# Altium footprint library Connector_Samtec_HLE_SMD.PcbLib: 290 footprints (part 14 of 24) (continued)
## Samtec_HLE-136-02-xxx-DV-A_2x36_P2.54mm_Horizontal [mm]
pads (74):
  rect 1.27x2.29 smd: 1(-44.45,2.525) 2(-44.45,-2.525) 3(-41.91,2.525) 4(-41.91,-2.525) 5(-39.37,2.525) 6(-39.37,-2.525) 7(-36.83,2.525) 8(-36.83,-2.525) 9(-34.29,2.525) 10(-34.29,-2.525) 11(-31.75,2.525) 12(-31.75,-2.525) 13(-29.21,2.525) 14(-29.21,-2.525) 15(-26.67,2.525) 16(-26.67,-2.525) 17(-24.13,2.525) 18(-24.13,-2.525) 19(-21.59,2.525) 20(-21.59,-2.525) 21(-19.05,2.525) 22(-19.05,-2.525) 23(-16.51,2.525) 24(-16.51,-2.525) 25(-13.97,2.525) 26(-13.97,-2.525) 27(-11.43,2.525) 28(-11.43,-2.525) 29(-8.89,2.525) 30(-8.89,-2.525) 31(-6.35,2.525) 32(-6.35,-2.525) 33(-3.81,2.525) 34(-3.81,-2.525) 35(-1.27,2.525) 36(-1.27,-2.525) 37(1.27,2.525) 38(1.27,-2.525) 39(3.81,2.525) 40(3.81,-2.525) 41(6.35,2.525) 42(6.35,-2.525) 43(8.89,2.525) 44(8.89,-2.525) 45(11.43,2.525) 46(11.43,-2.525) 47(13.97,2.525) 48(13.97,-2.525) 49(16.51,2.525) 50(16.51,-2.525) 51(19.05,2.525) 52(19.05,-2.525) 53(21.59,2.525) 54(21.59,-2.525) 55(24.13,2.525) 56(24.13,-2.525) 57(26.67,2.525) 58(26.67,-2.525) 59(29.21,2.525) 60(29.21,-2.525) 61(31.75,2.525) 62(31.75,-2.525) 63(34.29,2.525) 64(34.29,-2.525) 65(36.83,2.525) 66(36.83,-2.525) 67(39.37,2.525) 68(39.37,-2.525) 69(41.91,2.525) 70(41.91,-2.525) 71(44.45,2.525) 72(44.45,-2.525)
  round 1.78 hole 1.78: Un1(43.18,0) Un2(-43.18,0)
F.SilkS:
  lines w0.12: -45.345,-2.65 -45.83,-2.65 -45.83,2.65 -45.345,2.65 -45.345,3.67 ; -43.555,-2.65 -42.805,-2.65 ; -43.555,2.65 -42.805,2.65 ; -41.015,-2.65 -40.265,-2.65 ; -41.015,2.65 -40.265,2.65 ; -38.475,-2.65 -37.725,-2.65 ; -38.475,2.65 -37.725,2.65 ; -35.935,-2.65 -35.185,-2.65 ; -35.935,2.65 -35.185,2.65 ; -33.395,-2.65 -32.645,-2.65 ; -33.395,2.65 -32.645,2.65 ; -30.855,-2.65 -30.105,-2.65 ; -30.855,2.65 -30.105,2.65 ; -28.315,-2.65 -27.565,-2.65 ; -28.315,2.65 -27.565,2.65 ; -25.775,-2.65 -25.025,-2.65 ; -25.775,2.65 -25.025,2.65 ; -23.235,-2.65 -22.485,-2.65 ; -23.235,2.65 -22.485,2.65 ; -20.695,-2.65 -19.945,-2.65 ; -20.695,2.65 -19.945,2.65 ; -18.155,-2.65 -17.405,-2.65 ; -18.155,2.65 -17.405,2.65 ; -15.615,-2.65 -14.865,-2.65 ; -15.615,2.65 -14.865,2.65 ; -13.075,-2.65 -12.325,-2.65 ; -13.075,2.65 -12.325,2.65 ; -10.535,-2.65 -9.785,-2.65 ; -10.535,2.65 -9.785,2.65 ; -7.995,-2.65 -7.245,-2.65 ; -7.995,2.65 -7.245,2.65 ; -5.455,-2.65 -4.705,-2.65 ; -5.455,2.65 -4.705,2.65 ; -2.915,-2.65 -2.165,-2.65 ; -2.915,2.65 -2.165,2.65 ; -0.375,-2.65 0.375,-2.65 ; -0.375,2.65 0.375,2.65 ; 2.165,-2.65 2.915,-2.65 ; 2.165,2.65 2.915,2.65 ; 4.705,-2.65 5.455,-2.65 ; 4.705,2.65 5.455,2.65 ; 7.245,-2.65 7.995,-2.65 ; 7.245,2.65 7.995,2.65 ; 9.785,-2.65 10.535,-2.65 ; 9.785,2.65 10.535,2.65 ; 12.325,-2.65 13.075,-2.65 ; 12.325,2.65 13.075,2.65 ; 14.865,-2.65 15.615,-2.65 ; 14.865,2.65 15.615,2.65 ; 17.405,-2.65 18.155,-2.65 ; 17.405,2.65 18.155,2.65 ; 19.945,-2.65 20.695,-2.65 ; 19.945,2.65 20.695,2.65 ; 22.485,-2.65 23.235,-2.65 ; 22.485,2.65 23.235,2.65 ; 25.025,-2.65 25.775,-2.65 ; 25.025,2.65 25.775,2.65 ; 27.565,-2.65 28.315,-2.65 ; 27.565,2.65 28.315,2.65 ; 30.105,-2.65 30.855,-2.65 ; 30.105,2.65 30.855,2.65 ; 32.645,-2.65 33.395,-2.65 ; 32.645,2.65 33.395,2.65 ; 35.185,-2.65 35.935,-2.65 ; 35.185,2.65 35.935,2.65 ; 37.725,-2.65 38.475,-2.65 ; 37.725,2.65 38.475,2.65 ; 40.265,-2.65 41.015,-2.65 ; 40.265,2.65 41.015,2.65 ; 42.805,-2.65 43.555,-2.65 ; 42.805,2.65 43.555,2.65 ; 45.345,-2.65 45.83,-2.65 45.83,2.65 45.345,2.65
F.CrtYd:
  lines w0.05: -46.22,-4.17 -46.22,4.17 46.22,4.17 46.22,-4.17 -46.22,-4.17
F.Fab:
  lines w0.1: -44.95,2.54 -44.45,1.833 -43.95,2.54 ; -45.72,-2.54 45.72,-2.54 45.72,2.54 -45.72,2.54 -45.72,-2.54
  text "'.Designator'" at -4.047,-2.68 h1

## Samtec_HLE-136-02-xxx-DV-BE-A_2x36_P2.54mm_Horizontal [mm]
pads (146):
  rect 1.27x1.68 smd: 1(-44.45,2.72) 2(-44.45,-2.72) 3(-41.91,2.72) 4(-41.91,-2.72) 5(-39.37,2.72) 6(-39.37,-2.72) 7(-36.83,2.72) 8(-36.83,-2.72) 9(-34.29,2.72) 10(-34.29,-2.72) 11(-31.75,2.72) 12(-31.75,-2.72) 13(-29.21,2.72) 14(-29.21,-2.72) 15(-26.67,2.72) 16(-26.67,-2.72) 17(-24.13,2.72) 18(-24.13,-2.72) 19(-21.59,2.72) 20(-21.59,-2.72) 21(-19.05,2.72) 22(-19.05,-2.72) 23(-16.51,2.72) 24(-16.51,-2.72) 25(-13.97,2.72) 26(-13.97,-2.72) 27(-11.43,2.72) 28(-11.43,-2.72) 29(-8.89,2.72) 30(-8.89,-2.72) 31(-6.35,2.72) 32(-6.35,-2.72) 33(-3.81,2.72) 34(-3.81,-2.72) 35(-1.27,2.72) 36(-1.27,-2.72) 37(1.27,2.72) 38(1.27,-2.72) 39(3.81,2.72) 40(3.81,-2.72) 41(6.35,2.72) 42(6.35,-2.72) 43(8.89,2.72) 44(8.89,-2.72) 45(11.43,2.72) 46(11.43,-2.72) 47(13.97,2.72) 48(13.97,-2.72) 49(16.51,2.72) 50(16.51,-2.72) 51(19.05,2.72) 52(19.05,-2.72) 53(21.59,2.72) 54(21.59,-2.72) 55(24.13,2.72) 56(24.13,-2.72) 57(26.67,2.72) 58(26.67,-2.72) 59(29.21,2.72) 60(29.21,-2.72) 61(31.75,2.72) 62(31.75,-2.72) 63(34.29,2.72) 64(34.29,-2.72) 65(36.83,2.72) 66(36.83,-2.72) 67(39.37,2.72) 68(39.37,-2.72) 69(41.91,2.72) 70(41.91,-2.72) 71(44.45,2.72) 72(44.45,-2.72)
  round 0.97 hole 0.97: Un1(-8.89,-1.27) Un2(19.05,-1.27) Un3(44.45,-1.27) Un4(-3.81,1.27) Un5(-11.43,1.27) Un7(-19.05,1.27) Un8(-16.51,1.27) Un9(34.29,1.27) Un10(-36.83,1.27) Un11(-41.91,-1.27) Un12(-31.75,-1.27) Un13(21.59,-1.27) Un14(6.35,1.27) Un15(-16.51,-1.27) Un16(31.75,-1.27) Un18(-6.35,1.27) Un19(34.29,-1.27) Un20(-24.13,1.27) Un21(31.75,1.27) Un22(39.37,-1.27) Un23(24.13,-1.27) Un24(-21.59,-1.27) Un25(-13.97,1.27) Un26(44.45,1.27) Un27(-26.67,1.27) Un28(-11.43,-1.27) Un29(16.51,1.27) Un30(-13.97,-1.27) Un31(26.67,1.27) Un32(13.97,-1.27) Un33(39.37,1.27) Un34(16.51,-1.27) Un35(-44.45,1.27) Un36(-3.81,-1.27) Un37(-1.27,-1.27) Un38(-31.75,1.27) Un39(-24.13,-1.27) Un40(-1.27,1.27) Un41(-34.29,-1.27) Un42(11.43,1.27) Un43(29.21,-1.27) Un44(-19.05,-1.27) Un45(3.81,-1.27) Un46(-34.29,1.27) Un47(-39.37,1.27) Un48(21.59,1.27) Un49(13.97,1.27) Un50(-44.45,-1.27) Un51(24.13,1.27) Un52(11.43,-1.27) Un53(26.67,-1.27) Un54(6.35,-1.27) Un55(8.89,1.27) Un56(36.83,1.27) Un57(-6.35,-1.27) Un58(3.81,1.27) Un59(19.05,1.27) Un60(41.91,-1.27) Un61(1.27,1.27) Un62(-29.21,1.27) Un63(-21.59,1.27) Un64(-8.89,1.27) Un65(-41.91,1.27) Un66(-29.21,-1.27) Un67(29.21,1.27) Un68(1.27,-1.27) Un69(41.91,1.27) Un70(-39.37,-1.27) Un71(8.89,-1.27) Un72(36.83,-1.27) Un73(-26.67,-1.27) Un74(-36.83,-1.27)
  round 1.78 hole 1.78: Un6(-43.18,0) Un17(43.18,0)
F.SilkS:
  lines w0.12: -45.345,-2.65 -45.83,-2.65 -45.83,2.65 -45.345,2.65 -45.345,3.56 ; -43.555,-2.65 -42.805,-2.65 ; -43.555,2.65 -42.805,2.65 ; -41.015,-2.65 -40.265,-2.65 ; -41.015,2.65 -40.265,2.65 ; -38.475,-2.65 -37.725,-2.65 ; -38.475,2.65 -37.725,2.65 ; -35.935,-2.65 -35.185,-2.65 ; -35.935,2.65 -35.185,2.65 ; -33.395,-2.65 -32.645,-2.65 ; -33.395,2.65 -32.645,2.65 ; -30.855,-2.65 -30.105,-2.65 ; -30.855,2.65 -30.105,2.65 ; -28.315,-2.65 -27.565,-2.65 ; -28.315,2.65 -27.565,2.65 ; -25.775,-2.65 -25.025,-2.65 ; -25.775,2.65 -25.025,2.65 ; -23.235,-2.65 -22.485,-2.65 ; -23.235,2.65 -22.485,2.65 ; -20.695,-2.65 -19.945,-2.65 ; -20.695,2.65 -19.945,2.65 ; -18.155,-2.65 -17.405,-2.65 ; -18.155,2.65 -17.405,2.65 ; -15.615,-2.65 -14.865,-2.65 ; -15.615,2.65 -14.865,2.65 ; -13.075,-2.65 -12.325,-2.65 ; -13.075,2.65 -12.325,2.65 ; -10.535,-2.65 -9.785,-2.65 ; -10.535,2.65 -9.785,2.65 ; -7.995,-2.65 -7.245,-2.65 ; -7.995,2.65 -7.245,2.65 ; -5.455,-2.65 -4.705,-2.65 ; -5.455,2.65 -4.705,2.65 ; -2.915,-2.65 -2.165,-2.65 ; -2.915,2.65 -2.165,2.65 ; -0.375,-2.65 0.375,-2.65 ; -0.375,2.65 0.375,2.65 ; 2.165,-2.65 2.915,-2.65 ; 2.165,2.65 2.915,2.65 ; 4.705,-2.65 5.455,-2.65 ; 4.705,2.65 5.455,2.65 ; 7.245,-2.65 7.995,-2.65 ; 7.245,2.65 7.995,2.65 ; 9.785,-2.65 10.535,-2.65 ; 9.785,2.65 10.535,2.65 ; 12.325,-2.65 13.075,-2.65 ; 12.325,2.65 13.075,2.65 ; 14.865,-2.65 15.615,-2.65 ; 14.865,2.65 15.615,2.65 ; 17.405,-2.65 18.155,-2.65 ; 17.405,2.65 18.155,2.65 ; 19.945,-2.65 20.695,-2.65 ; 19.945,2.65 20.695,2.65 ; 22.485,-2.65 23.235,-2.65 ; 22.485,2.65 23.235,2.65 ; 25.025,-2.65 25.775,-2.65 ; 25.025,2.65 25.775,2.65 ; 27.565,-2.65 28.315,-2.65 ; 27.565,2.65 28.315,2.65 ; 30.105,-2.65 30.855,-2.65 ; 30.105,2.65 30.855,2.65 ; 32.645,-2.65 33.395,-2.65 ; 32.645,2.65 33.395,2.65 ; 35.185,-2.65 35.935,-2.65 ; 35.185,2.65 35.935,2.65 ; 37.725,-2.65 38.475,-2.65 ; 37.725,2.65 38.475,2.65 ; 40.265,-2.65 41.015,-2.65 ; 40.265,2.65 41.015,2.65 ; 42.805,-2.65 43.555,-2.65 ; 42.805,2.65 43.555,2.65 ; 45.345,-2.65 45.83,-2.65 45.83,2.65 45.345,2.65
F.CrtYd:
  lines w0.05: -46.22,-4.06 46.22,-4.06 46.22,4.06 -46.22,4.06 -46.22,-4.06
F.Fab:
  lines w0.1: -44.95,2.54 -44.45,1.833 -43.95,2.54 ; -45.72,-2.54 -45.72,2.54 45.72,2.54 45.72,-2.54 -45.72,-2.54
  text "'.Designator'" at -4.047,-2.68 h1

## Samtec_HLE-136-02-xxx-DV-BE-LC_2x36_P2.54mm_Horizontal [mm]
pads (146):
  rect 1.27x1.68 smd: 1(-44.45,2.72) 2(-44.45,-2.72) 3(-41.91,2.72) 4(-41.91,-2.72) 5(-39.37,2.72) 6(-39.37,-2.72) 7(-36.83,2.72) 8(-36.83,-2.72) 9(-34.29,2.72) 10(-34.29,-2.72) 11(-31.75,2.72) 12(-31.75,-2.72) 13(-29.21,2.72) 14(-29.21,-2.72) 15(-26.67,2.72) 16(-26.67,-2.72) 17(-24.13,2.72) 18(-24.13,-2.72) 19(-21.59,2.72) 20(-21.59,-2.72) 21(-19.05,2.72) 22(-19.05,-2.72) 23(-16.51,2.72) 24(-16.51,-2.72) 25(-13.97,2.72) 26(-13.97,-2.72) 27(-11.43,2.72) 28(-11.43,-2.72) 29(-8.89,2.72) 30(-8.89,-2.72) 31(-6.35,2.72) 32(-6.35,-2.72) 33(-3.81,2.72) 34(-3.81,-2.72) 35(-1.27,2.72) 36(-1.27,-2.72) 37(1.27,2.72) 38(1.27,-2.72) 39(3.81,2.72) 40(3.81,-2.72) 41(6.35,2.72) 42(6.35,-2.72) 43(8.89,2.72) 44(8.89,-2.72) 45(11.43,2.72) 46(11.43,-2.72) 47(13.97,2.72) 48(13.97,-2.72) 49(16.51,2.72) 50(16.51,-2.72) 51(19.05,2.72) 52(19.05,-2.72) 53(21.59,2.72) 54(21.59,-2.72) 55(24.13,2.72) 56(24.13,-2.72) 57(26.67,2.72) 58(26.67,-2.72) 59(29.21,2.72) 60(29.21,-2.72) 61(31.75,2.72) 62(31.75,-2.72) 63(34.29,2.72) 64(34.29,-2.72) 65(36.83,2.72) 66(36.83,-2.72) 67(39.37,2.72) 68(39.37,-2.72) 69(41.91,2.72) 70(41.91,-2.72) 71(44.45,2.72) 72(44.45,-2.72)
  round 0.97 hole 0.97: Un1(19.05,1.27) Un2(34.29,-1.27) Un3(-31.75,1.27) Un4(-13.97,-1.27) Un5(44.45,1.27) Un6(24.13,1.27) Un7(-34.29,-1.27) Un8(-13.97,1.27) Un9(41.91,1.27) Un10(36.83,1.27) Un12(41.91,-1.27) Un13(26.67,1.27) Un14(11.43,1.27) Un15(6.35,-1.27) Un16(-8.89,-1.27) Un17(-11.43,-1.27) Un18(19.05,-1.27) Un19(-3.81,1.27) Un20(31.75,1.27) Un21(-29.21,-1.27) Un22(-24.13,1.27) Un23(-21.59,-1.27) Un24(39.37,1.27) Un25(3.81,-1.27) Un26(13.97,1.27) Un27(-26.67,1.27) Un28(-29.21,1.27) Un30(-21.59,1.27) Un31(-44.45,1.27) Un32(13.97,-1.27) Un33(39.37,-1.27) Un34(29.21,-1.27) Un35(-34.29,1.27) Un36(-26.67,-1.27) Un37(-41.91,1.27) Un38(8.89,1.27) Un39(21.59,1.27) Un40(31.75,-1.27) Un41(16.51,1.27) Un42(-8.89,1.27) Un43(34.29,1.27) Un44(24.13,-1.27) Un45(-19.05,1.27) Un46(-31.75,-1.27) Un47(16.51,-1.27) Un48(11.43,-1.27) Un49(-36.83,1.27) Un50(1.27,1.27) Un51(-19.05,-1.27) Un52(-41.91,-1.27) Un53(-44.45,-1.27) Un54(-16.51,1.27) Un55(-1.27,-1.27) Un56(-36.83,-1.27) Un57(-11.43,1.27) Un58(-39.37,-1.27) Un59(3.81,1.27) Un60(36.83,-1.27) Un61(8.89,-1.27) Un62(1.27,-1.27) Un63(-6.35,-1.27) Un64(21.59,-1.27) Un65(44.45,-1.27) Un66(29.21,1.27) Un67(6.35,1.27) Un68(-1.27,1.27) Un69(-16.51,-1.27) Un70(-39.37,1.27) Un71(-3.81,-1.27) Un72(-24.13,-1.27) Un73(26.67,-1.27) Un74(-6.35,1.27)
  round 1.19 hole 1.19: Un11(43.18,0) Un29(-43.18,0)
F.SilkS:
  lines w0.12: -45.345,-2.65 -45.83,-2.65 -45.83,2.65 -45.345,2.65 -45.345,3.56 ; -43.555,-2.65 -42.805,-2.65 ; -43.555,2.65 -42.805,2.65 ; -41.015,-2.65 -40.265,-2.65 ; -41.015,2.65 -40.265,2.65 ; -38.475,-2.65 -37.725,-2.65 ; -38.475,2.65 -37.725,2.65 ; -35.935,-2.65 -35.185,-2.65 ; -35.935,2.65 -35.185,2.65 ; -33.395,-2.65 -32.645,-2.65 ; -33.395,2.65 -32.645,2.65 ; -30.855,-2.65 -30.105,-2.65 ; -30.855,2.65 -30.105,2.65 ; -28.315,-2.65 -27.565,-2.65 ; -28.315,2.65 -27.565,2.65 ; -25.775,-2.65 -25.025,-2.65 ; -25.775,2.65 -25.025,2.65 ; -23.235,-2.65 -22.485,-2.65 ; -23.235,2.65 -22.485,2.65 ; -20.695,-2.65 -19.945,-2.65 ; -20.695,2.65 -19.945,2.65 ; -18.155,-2.65 -17.405,-2.65 ; -18.155,2.65 -17.405,2.65 ; -15.615,-2.65 -14.865,-2.65 ; -15.615,2.65 -14.865,2.65 ; -13.075,-2.65 -12.325,-2.65 ; -13.075,2.65 -12.325,2.65 ; -10.535,-2.65 -9.785,-2.65 ; -10.535,2.65 -9.785,2.65 ; -7.995,-2.65 -7.245,-2.65 ; -7.995,2.65 -7.245,2.65 ; -5.455,-2.65 -4.705,-2.65 ; -5.455,2.65 -4.705,2.65 ; -2.915,-2.65 -2.165,-2.65 ; -2.915,2.65 -2.165,2.65 ; -0.375,-2.65 0.375,-2.65 ; -0.375,2.65 0.375,2.65 ; 2.165,-2.65 2.915,-2.65 ; 2.165,2.65 2.915,2.65 ; 4.705,-2.65 5.455,-2.65 ; 4.705,2.65 5.455,2.65 ; 7.245,-2.65 7.995,-2.65 ; 7.245,2.65 7.995,2.65 ; 9.785,-2.65 10.535,-2.65 ; 9.785,2.65 10.535,2.65 ; 12.325,-2.65 13.075,-2.65 ; 12.325,2.65 13.075,2.65 ; 14.865,-2.65 15.615,-2.65 ; 14.865,2.65 15.615,2.65 ; 17.405,-2.65 18.155,-2.65 ; 17.405,2.65 18.155,2.65 ; 19.945,-2.65 20.695,-2.65 ; 19.945,2.65 20.695,2.65 ; 22.485,-2.65 23.235,-2.65 ; 22.485,2.65 23.235,2.65 ; 25.025,-2.65 25.775,-2.65 ; 25.025,2.65 25.775,2.65 ; 27.565,-2.65 28.315,-2.65 ; 27.565,2.65 28.315,2.65 ; 30.105,-2.65 30.855,-2.65 ; 30.105,2.65 30.855,2.65 ; 32.645,-2.65 33.395,-2.65 ; 32.645,2.65 33.395,2.65 ; 35.185,-2.65 35.935,-2.65 ; 35.185,2.65 35.935,2.65 ; 37.725,-2.65 38.475,-2.65 ; 37.725,2.65 38.475,2.65 ; 40.265,-2.65 41.015,-2.65 ; 40.265,2.65 41.015,2.65 ; 42.805,-2.65 43.555,-2.65 ; 42.805,2.65 43.555,2.65 ; 45.345,-2.65 45.83,-2.65 45.83,2.65 45.345,2.65
F.CrtYd:
  lines w0.05: -46.22,-4.06 46.22,-4.06 46.22,4.06 -46.22,4.06 -46.22,-4.06
F.Fab:
  lines w0.1: -44.95,2.54 -44.45,1.833 -43.95,2.54 ; -45.72,-2.54 45.72,-2.54 45.72,2.54 -45.72,2.54 -45.72,-2.54
  text "'.Designator'" at -4.047,-2.68 h1

## Samtec_HLE-136-02-xxx-DV-BE_2x36_P2.54mm_Horizontal [mm]
pads (144):
  rect 1.27x1.68 smd: 1(-44.45,2.72) 2(-44.45,-2.72) 3(-41.91,2.72) 4(-41.91,-2.72) 5(-39.37,2.72) 6(-39.37,-2.72) 7(-36.83,2.72) 8(-36.83,-2.72) 9(-34.29,2.72) 10(-34.29,-2.72) 11(-31.75,2.72) 12(-31.75,-2.72) 13(-29.21,2.72) 14(-29.21,-2.72) 15(-26.67,2.72) 16(-26.67,-2.72) 17(-24.13,2.72) 18(-24.13,-2.72) 19(-21.59,2.72) 20(-21.59,-2.72) 21(-19.05,2.72) 22(-19.05,-2.72) 23(-16.51,2.72) 24(-16.51,-2.72) 25(-13.97,2.72) 26(-13.97,-2.72) 27(-11.43,2.72) 28(-11.43,-2.72) 29(-8.89,2.72) 30(-8.89,-2.72) 31(-6.35,2.72) 32(-6.35,-2.72) 33(-3.81,2.72) 34(-3.81,-2.72) 35(-1.27,2.72) 36(-1.27,-2.72) 37(1.27,2.72) 38(1.27,-2.72) 39(3.81,2.72) 40(3.81,-2.72) 41(6.35,2.72) 42(6.35,-2.72) 43(8.89,2.72) 44(8.89,-2.72) 45(11.43,2.72) 46(11.43,-2.72) 47(13.97,2.72) 48(13.97,-2.72) 49(16.51,2.72) 50(16.51,-2.72) 51(19.05,2.72) 52(19.05,-2.72) 53(21.59,2.72) 54(21.59,-2.72) 55(24.13,2.72) 56(24.13,-2.72) 57(26.67,2.72) 58(26.67,-2.72) 59(29.21,2.72) 60(29.21,-2.72) 61(31.75,2.72) 62(31.75,-2.72) 63(34.29,2.72) 64(34.29,-2.72) 65(36.83,2.72) 66(36.83,-2.72) 67(39.37,2.72) 68(39.37,-2.72) 69(41.91,2.72) 70(41.91,-2.72) 71(44.45,2.72) 72(44.45,-2.72)
  round 0.97 hole 0.97: Un1(31.75,-1.27) Un2(6.35,-1.27) Un3(13.97,-1.27) Un4(-44.45,-1.27) Un5(-1.27,-1.27) Un6(-24.13,1.27) Un7(-21.59,-1.27) Un8(-16.51,1.27) Un9(26.67,1.27) Un10(3.81,1.27) Un11(41.91,-1.27) Un12(19.05,1.27) Un13(-11.43,-1.27) Un14(-8.89,-1.27) Un15(6.35,1.27) Un16(24.13,1.27) Un17(44.45,1.27) Un18(13.97,1.27) Un19(-31.75,1.27) Un20(-21.59,1.27) Un21(-24.13,-1.27) Un22(-29.21,-1.27) Un23(-36.83,-1.27) Un24(-41.91,1.27) Un25(8.89,1.27) Un26(8.89,-1.27) Un27(41.91,1.27) Un28(-13.97,1.27) Un29(11.43,-1.27) Un30(-36.83,1.27) Un31(21.59,-1.27) Un32(-13.97,-1.27) Un33(24.13,-1.27) Un34(-16.51,-1.27) Un35(3.81,-1.27) Un36(1.27,1.27) Un37(-34.29,1.27) Un38(-44.45,1.27) Un39(-3.81,1.27) Un40(31.75,1.27) Un41(16.51,1.27) Un42(-6.35,1.27) Un43(-41.91,-1.27) Un44(-39.37,-1.27) Un45(36.83,1.27) Un46(-31.75,-1.27) Un47(-3.81,-1.27) Un48(-34.29,-1.27) Un49(1.27,-1.27) Un50(16.51,-1.27) Un51(-11.43,1.27) Un52(-19.05,-1.27) Un53(-26.67,1.27) Un54(-39.37,1.27) Un55(-26.67,-1.27) Un56(36.83,-1.27) Un57(-19.05,1.27) Un58(21.59,1.27) Un59(29.21,1.27) Un60(26.67,-1.27) Un61(11.43,1.27) Un62(-8.89,1.27) Un63(-1.27,1.27) Un64(39.37,1.27) Un65(29.21,-1.27) Un66(-6.35,-1.27) Un67(19.05,-1.27) Un68(34.29,1.27) Un69(-29.21,1.27) Un70(39.37,-1.27) Un71(34.29,-1.27) Un72(44.45,-1.27)
F.SilkS:
  lines w0.12: -45.345,-2.65 -45.83,-2.65 -45.83,2.65 -45.345,2.65 -45.345,3.56 ; -43.555,-2.65 -42.805,-2.65 ; -43.555,2.65 -42.805,2.65 ; -41.015,-2.65 -40.265,-2.65 ; -41.015,2.65 -40.265,2.65 ; -38.475,-2.65 -37.725,-2.65 ; -38.475,2.65 -37.725,2.65 ; -35.935,-2.65 -35.185,-2.65 ; -35.935,2.65 -35.185,2.65 ; -33.395,-2.65 -32.645,-2.65 ; -33.395,2.65 -32.645,2.65 ; -30.855,-2.65 -30.105,-2.65 ; -30.855,2.65 -30.105,2.65 ; -28.315,-2.65 -27.565,-2.65 ; -28.315,2.65 -27.565,2.65 ; -25.775,-2.65 -25.025,-2.65 ; -25.775,2.65 -25.025,2.65 ; -23.235,-2.65 -22.485,-2.65 ; -23.235,2.65 -22.485,2.65 ; -20.695,-2.65 -19.945,-2.65 ; -20.695,2.65 -19.945,2.65 ; -18.155,-2.65 -17.405,-2.65 ; -18.155,2.65 -17.405,2.65 ; -15.615,-2.65 -14.865,-2.65 ; -15.615,2.65 -14.865,2.65 ; -13.075,-2.65 -12.325,-2.65 ; -13.075,2.65 -12.325,2.65 ; -10.535,-2.65 -9.785,-2.65 ; -10.535,2.65 -9.785,2.65 ; -7.995,-2.65 -7.245,-2.65 ; -7.995,2.65 -7.245,2.65 ; -5.455,-2.65 -4.705,-2.65 ; -5.455,2.65 -4.705,2.65 ; -2.915,-2.65 -2.165,-2.65 ; -2.915,2.65 -2.165,2.65 ; -0.375,-2.65 0.375,-2.65 ; -0.375,2.65 0.375,2.65 ; 2.165,-2.65 2.915,-2.65 ; 2.165,2.65 2.915,2.65 ; 4.705,-2.65 5.455,-2.65 ; 4.705,2.65 5.455,2.65 ; 7.245,-2.65 7.995,-2.65 ; 7.245,2.65 7.995,2.65 ; 9.785,-2.65 10.535,-2.65 ; 9.785,2.65 10.535,2.65 ; 12.325,-2.65 13.075,-2.65 ; 12.325,2.65 13.075,2.65 ; 14.865,-2.65 15.615,-2.65 ; 14.865,2.65 15.615,2.65 ; 17.405,-2.65 18.155,-2.65 ; 17.405,2.65 18.155,2.65 ; 19.945,-2.65 20.695,-2.65 ; 19.945,2.65 20.695,2.65 ; 22.485,-2.65 23.235,-2.65 ; 22.485,2.65 23.235,2.65 ; 25.025,-2.65 25.775,-2.65 ; 25.025,2.65 25.775,2.65 ; 27.565,-2.65 28.315,-2.65 ; 27.565,2.65 28.315,2.65 ; 30.105,-2.65 30.855,-2.65 ; 30.105,2.65 30.855,2.65 ; 32.645,-2.65 33.395,-2.65 ; 32.645,2.65 33.395,2.65 ; 35.185,-2.65 35.935,-2.65 ; 35.185,2.65 35.935,2.65 ; 37.725,-2.65 38.475,-2.65 ; 37.725,2.65 38.475,2.65 ; 40.265,-2.65 41.015,-2.65 ; 40.265,2.65 41.015,2.65 ; 42.805,-2.65 43.555,-2.65 ; 42.805,2.65 43.555,2.65 ; 45.345,-2.65 45.83,-2.65 45.83,2.65 45.345,2.65
F.CrtYd:
  lines w0.05: -46.22,-4.06 -46.22,4.06 46.22,4.06 46.22,-4.06 -46.22,-4.06
F.Fab:
  lines w0.1: -44.95,2.54 -44.45,1.833 -43.95,2.54 ; -45.72,-2.54 -45.72,2.54 45.72,2.54 45.72,-2.54 -45.72,-2.54
  text "'.Designator'" at -4.047,-2.68 h1

## Samtec_HLE-136-02-xxx-DV-LC_2x36_P2.54mm_Horizontal [mm]
pads (74):
  rect 1.27x2.29 smd: 1(-44.45,2.525) 2(-44.45,-2.525) 3(-41.91,2.525) 4(-41.91,-2.525) 5(-39.37,2.525) 6(-39.37,-2.525) 7(-36.83,2.525) 8(-36.83,-2.525) 9(-34.29,2.525) 10(-34.29,-2.525) 11(-31.75,2.525) 12(-31.75,-2.525) 13(-29.21,2.525) 14(-29.21,-2.525) 15(-26.67,2.525) 16(-26.67,-2.525) 17(-24.13,2.525) 18(-24.13,-2.525) 19(-21.59,2.525) 20(-21.59,-2.525) 21(-19.05,2.525) 22(-19.05,-2.525) 23(-16.51,2.525) 24(-16.51,-2.525) 25(-13.97,2.525) 26(-13.97,-2.525) 27(-11.43,2.525) 28(-11.43,-2.525) 29(-8.89,2.525) 30(-8.89,-2.525) 31(-6.35,2.525) 32(-6.35,-2.525) 33(-3.81,2.525) 34(-3.81,-2.525) 35(-1.27,2.525) 36(-1.27,-2.525) 37(1.27,2.525) 38(1.27,-2.525) 39(3.81,2.525) 40(3.81,-2.525) 41(6.35,2.525) 42(6.35,-2.525) 43(8.89,2.525) 44(8.89,-2.525) 45(11.43,2.525) 46(11.43,-2.525) 47(13.97,2.525) 48(13.97,-2.525) 49(16.51,2.525) 50(16.51,-2.525) 51(19.05,2.525) 52(19.05,-2.525) 53(21.59,2.525) 54(21.59,-2.525) 55(24.13,2.525) 56(24.13,-2.525) 57(26.67,2.525) 58(26.67,-2.525) 59(29.21,2.525) 60(29.21,-2.525) 61(31.75,2.525) 62(31.75,-2.525) 63(34.29,2.525) 64(34.29,-2.525) 65(36.83,2.525) 66(36.83,-2.525) 67(39.37,2.525) 68(39.37,-2.525) 69(41.91,2.525) 70(41.91,-2.525) 71(44.45,2.525) 72(44.45,-2.525)
  round 1.19 hole 1.19: Un1(43.18,0) Un2(-43.18,0)
F.SilkS:
  lines w0.12: -45.345,-2.65 -45.83,-2.65 -45.83,2.65 -45.345,2.65 -45.345,3.67 ; -43.555,-2.65 -42.805,-2.65 ; -43.555,2.65 -42.805,2.65 ; -41.015,-2.65 -40.265,-2.65 ; -41.015,2.65 -40.265,2.65 ; -38.475,-2.65 -37.725,-2.65 ; -38.475,2.65 -37.725,2.65 ; -35.935,-2.65 -35.185,-2.65 ; -35.935,2.65 -35.185,2.65 ; -33.395,-2.65 -32.645,-2.65 ; -33.395,2.65 -32.645,2.65 ; -30.855,-2.65 -30.105,-2.65 ; -30.855,2.65 -30.105,2.65 ; -28.315,-2.65 -27.565,-2.65 ; -28.315,2.65 -27.565,2.65 ; -25.775,-2.65 -25.025,-2.65 ; -25.775,2.65 -25.025,2.65 ; -23.235,-2.65 -22.485,-2.65 ; -23.235,2.65 -22.485,2.65 ; -20.695,-2.65 -19.945,-2.65 ; -20.695,2.65 -19.945,2.65 ; -18.155,-2.65 -17.405,-2.65 ; -18.155,2.65 -17.405,2.65 ; -15.615,-2.65 -14.865,-2.65 ; -15.615,2.65 -14.865,2.65 ; -13.075,-2.65 -12.325,-2.65 ; -13.075,2.65 -12.325,2.65 ; -10.535,-2.65 -9.785,-2.65 ; -10.535,2.65 -9.785,2.65 ; -7.995,-2.65 -7.245,-2.65 ; -7.995,2.65 -7.245,2.65 ; -5.455,-2.65 -4.705,-2.65 ; -5.455,2.65 -4.705,2.65 ; -2.915,-2.65 -2.165,-2.65 ; -2.915,2.65 -2.165,2.65 ; -0.375,-2.65 0.375,-2.65 ; -0.375,2.65 0.375,2.65 ; 2.165,-2.65 2.915,-2.65 ; 2.165,2.65 2.915,2.65 ; 4.705,-2.65 5.455,-2.65 ; 4.705,2.65 5.455,2.65 ; 7.245,-2.65 7.995,-2.65 ; 7.245,2.65 7.995,2.65 ; 9.785,-2.65 10.535,-2.65 ; 9.785,2.65 10.535,2.65 ; 12.325,-2.65 13.075,-2.65 ; 12.325,2.65 13.075,2.65 ; 14.865,-2.65 15.615,-2.65 ; 14.865,2.65 15.615,2.65 ; 17.405,-2.65 18.155,-2.65 ; 17.405,2.65 18.155,2.65 ; 19.945,-2.65 20.695,-2.65 ; 19.945,2.65 20.695,2.65 ; 22.485,-2.65 23.235,-2.65 ; 22.485,2.65 23.235,2.65 ; 25.025,-2.65 25.775,-2.65 ; 25.025,2.65 25.775,2.65 ; 27.565,-2.65 28.315,-2.65 ; 27.565,2.65 28.315,2.65 ; 30.105,-2.65 30.855,-2.65 ; 30.105,2.65 30.855,2.65 ; 32.645,-2.65 33.395,-2.65 ; 32.645,2.65 33.395,2.65 ; 35.185,-2.65 35.935,-2.65 ; 35.185,2.65 35.935,2.65 ; 37.725,-2.65 38.475,-2.65 ; 37.725,2.65 38.475,2.65 ; 40.265,-2.65 41.015,-2.65 ; 40.265,2.65 41.015,2.65 ; 42.805,-2.65 43.555,-2.65 ; 42.805,2.65 43.555,2.65 ; 45.345,-2.65 45.83,-2.65 45.83,2.65 45.345,2.65
F.CrtYd:
  lines w0.05: -46.22,-4.17 -46.22,4.17 46.22,4.17 46.22,-4.17 -46.22,-4.17
F.Fab:
  lines w0.1: -44.95,2.54 -44.45,1.833 -43.95,2.54 ; -45.72,-2.54 -45.72,2.54 45.72,2.54 45.72,-2.54 -45.72,-2.54
  text "'.Designator'" at -4.047,-2.68 h1

## Samtec_HLE-136-02-xxx-DV_2x36_P2.54mm_Horizontal [mm]
pads (72):
  rect 1.27x2.29 smd: 1(-44.45,2.525) 2(-44.45,-2.525) 3(-41.91,2.525) 4(-41.91,-2.525) 5(-39.37,2.525) 6(-39.37,-2.525) 7(-36.83,2.525) 8(-36.83,-2.525) 9(-34.29,2.525) 10(-34.29,-2.525) 11(-31.75,2.525) 12(-31.75,-2.525) 13(-29.21,2.525) 14(-29.21,-2.525) 15(-26.67,2.525) 16(-26.67,-2.525) 17(-24.13,2.525) 18(-24.13,-2.525) 19(-21.59,2.525) 20(-21.59,-2.525) 21(-19.05,2.525) 22(-19.05,-2.525) 23(-16.51,2.525) 24(-16.51,-2.525) 25(-13.97,2.525) 26(-13.97,-2.525) 27(-11.43,2.525) 28(-11.43,-2.525) 29(-8.89,2.525) 30(-8.89,-2.525) 31(-6.35,2.525) 32(-6.35,-2.525) 33(-3.81,2.525) 34(-3.81,-2.525) 35(-1.27,2.525) 36(-1.27,-2.525) 37(1.27,2.525) 38(1.27,-2.525) 39(3.81,2.525) 40(3.81,-2.525) 41(6.35,2.525) 42(6.35,-2.525) 43(8.89,2.525) 44(8.89,-2.525) 45(11.43,2.525) 46(11.43,-2.525) 47(13.97,2.525) 48(13.97,-2.525) 49(16.51,2.525) 50(16.51,-2.525) 51(19.05,2.525) 52(19.05,-2.525) 53(21.59,2.525) 54(21.59,-2.525) 55(24.13,2.525) 56(24.13,-2.525) 57(26.67,2.525) 58(26.67,-2.525) 59(29.21,2.525) 60(29.21,-2.525) 61(31.75,2.525) 62(31.75,-2.525) 63(34.29,2.525) 64(34.29,-2.525) 65(36.83,2.525) 66(36.83,-2.525) 67(39.37,2.525) 68(39.37,-2.525) 69(41.91,2.525) 70(41.91,-2.525) 71(44.45,2.525) 72(44.45,-2.525)
F.SilkS:
  lines w0.12: -45.345,-2.65 -45.83,-2.65 -45.83,2.65 -45.345,2.65 -45.345,3.67 ; -43.555,-2.65 -42.805,-2.65 ; -43.555,2.65 -42.805,2.65 ; -41.015,-2.65 -40.265,-2.65 ; -41.015,2.65 -40.265,2.65 ; -38.475,-2.65 -37.725,-2.65 ; -38.475,2.65 -37.725,2.65 ; -35.935,-2.65 -35.185,-2.65 ; -35.935,2.65 -35.185,2.65 ; -33.395,-2.65 -32.645,-2.65 ; -33.395,2.65 -32.645,2.65 ; -30.855,-2.65 -30.105,-2.65 ; -30.855,2.65 -30.105,2.65 ; -28.315,-2.65 -27.565,-2.65 ; -28.315,2.65 -27.565,2.65 ; -25.775,-2.65 -25.025,-2.65 ; -25.775,2.65 -25.025,2.65 ; -23.235,-2.65 -22.485,-2.65 ; -23.235,2.65 -22.485,2.65 ; -20.695,-2.65 -19.945,-2.65 ; -20.695,2.65 -19.945,2.65 ; -18.155,-2.65 -17.405,-2.65 ; -18.155,2.65 -17.405,2.65 ; -15.615,-2.65 -14.865,-2.65 ; -15.615,2.65 -14.865,2.65 ; -13.075,-2.65 -12.325,-2.65 ; -13.075,2.65 -12.325,2.65 ; -10.535,-2.65 -9.785,-2.65 ; -10.535,2.65 -9.785,2.65 ; -7.995,-2.65 -7.245,-2.65 ; -7.995,2.65 -7.245,2.65 ; -5.455,-2.65 -4.705,-2.65 ; -5.455,2.65 -4.705,2.65 ; -2.915,-2.65 -2.165,-2.65 ; -2.915,2.65 -2.165,2.65 ; -0.375,-2.65 0.375,-2.65 ; -0.375,2.65 0.375,2.65 ; 2.165,-2.65 2.915,-2.65 ; 2.165,2.65 2.915,2.65 ; 4.705,-2.65 5.455,-2.65 ; 4.705,2.65 5.455,2.65 ; 7.245,-2.65 7.995,-2.65 ; 7.245,2.65 7.995,2.65 ; 9.785,-2.65 10.535,-2.65 ; 9.785,2.65 10.535,2.65 ; 12.325,-2.65 13.075,-2.65 ; 12.325,2.65 13.075,2.65 ; 14.865,-2.65 15.615,-2.65 ; 14.865,2.65 15.615,2.65 ; 17.405,-2.65 18.155,-2.65 ; 17.405,2.65 18.155,2.65 ; 19.945,-2.65 20.695,-2.65 ; 19.945,2.65 20.695,2.65 ; 22.485,-2.65 23.235,-2.65 ; 22.485,2.65 23.235,2.65 ; 25.025,-2.65 25.775,-2.65 ; 25.025,2.65 25.775,2.65 ; 27.565,-2.65 28.315,-2.65 ; 27.565,2.65 28.315,2.65 ; 30.105,-2.65 30.855,-2.65 ; 30.105,2.65 30.855,2.65 ; 32.645,-2.65 33.395,-2.65 ; 32.645,2.65 33.395,2.65 ; 35.185,-2.65 35.935,-2.65 ; 35.185,2.65 35.935,2.65 ; 37.725,-2.65 38.475,-2.65 ; 37.725,2.65 38.475,2.65 ; 40.265,-2.65 41.015,-2.65 ; 40.265,2.65 41.015,2.65 ; 42.805,-2.65 43.555,-2.65 ; 42.805,2.65 43.555,2.65 ; 45.345,-2.65 45.83,-2.65 45.83,2.65 45.345,2.65
F.CrtYd:
  lines w0.05: -46.22,-4.17 -46.22,4.17 46.22,4.17 46.22,-4.17 -46.22,-4.17
F.Fab:
  lines w0.1: -44.95,2.54 -44.45,1.833 -43.95,2.54 ; -45.72,-2.54 45.72,-2.54 45.72,2.54 -45.72,2.54 -45.72,-2.54
  text "'.Designator'" at -4.047,-2.68 h1